# Altium footprint library Footprints_SOC.PcbLib: 182 footprints (part 11 of 12)
Each footprint in its own frame and in the unit in brackets; x right, y up, seen from the top. Pads: shape width x height; smd on the part's side, far side on the other; paste and mask are expansions set on the pad; w line width, h text height; cw(c..) or ccw(c..) is an arc to the next point about the centre after c.
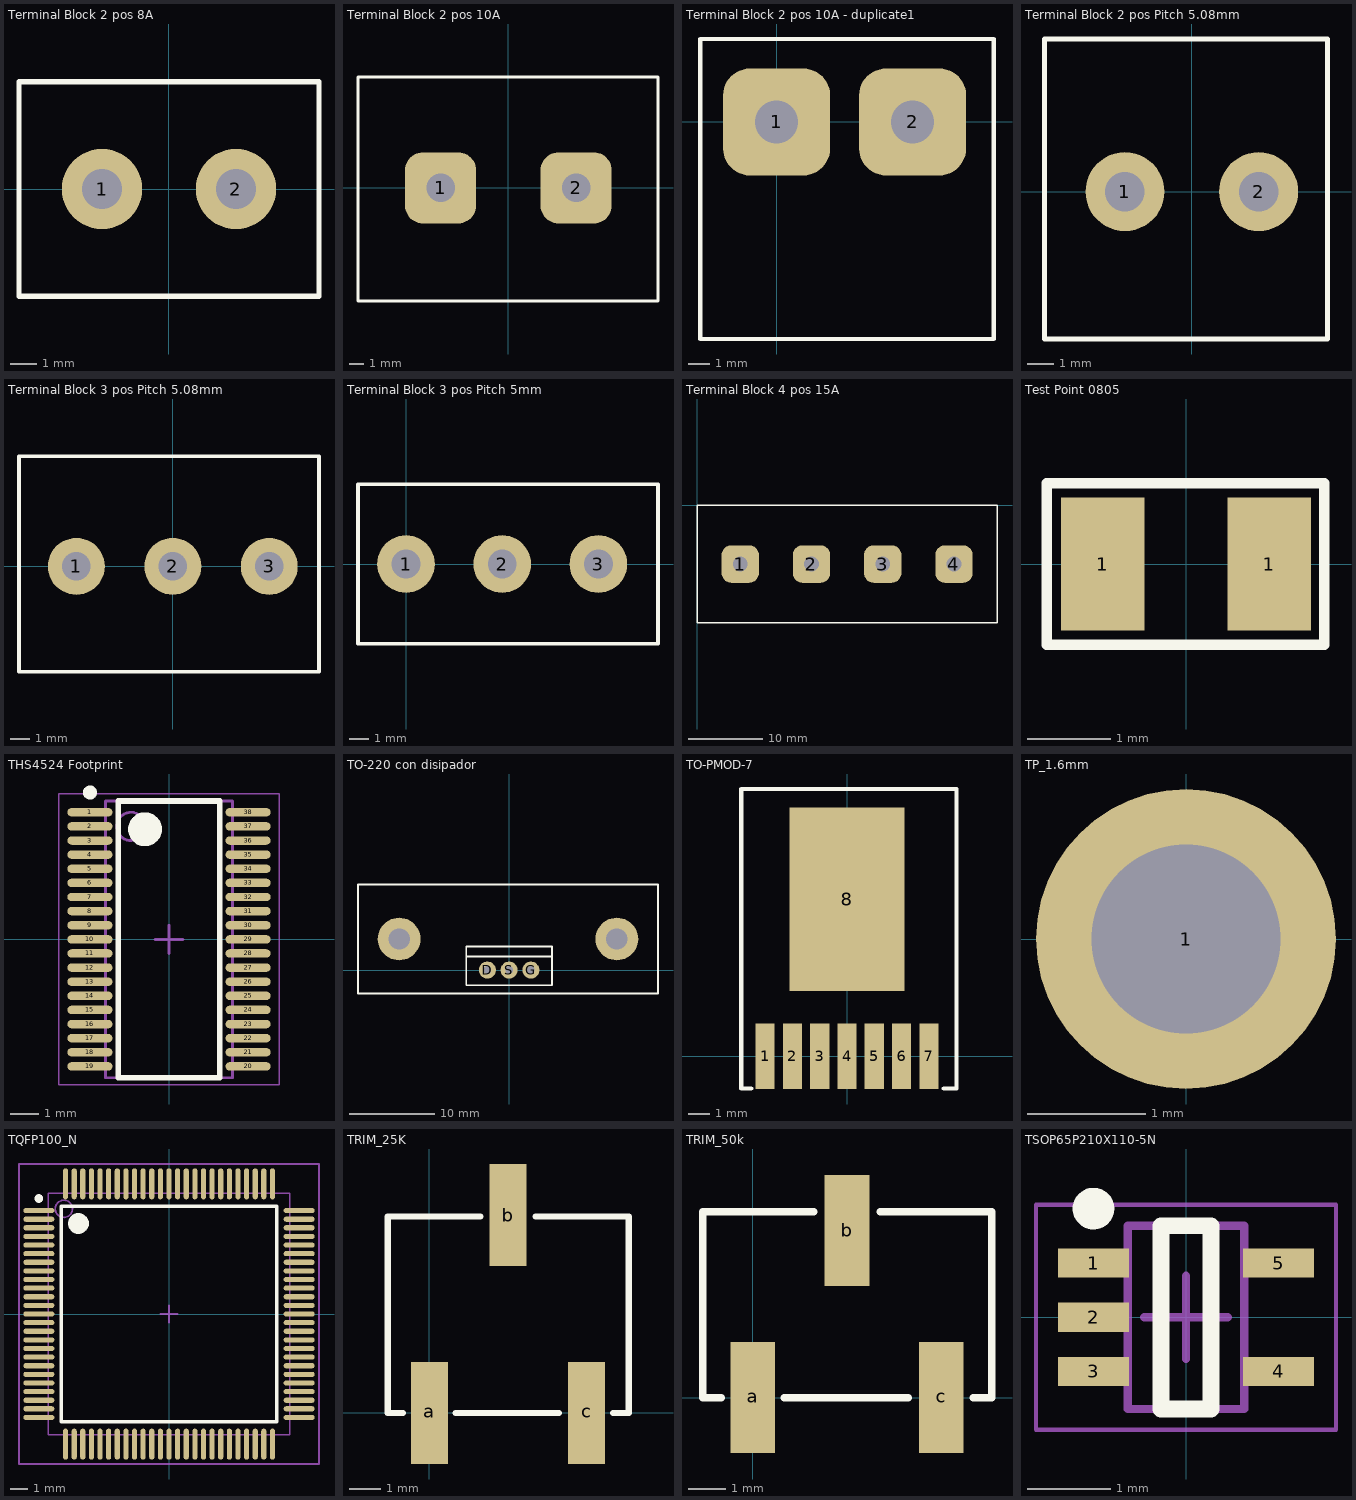
[diagram p10: the footprints below, top view; thin cyan lines are the x and y axes]

## Terminal Block 2 pos 8A [mm] "Wurth Electronics Inc. Pitch=5mm"
pads (2):
  round 3 hole 1.5: 1(-2.5,0) 2(2.5,0)
Top Overlay:
  lines w0.2: -5.6,-4 5.6,-4 5.6,4 -5.6,4 -5.6,-4
3D body "Terminal block pitch 5mm 2 pos (691111710002).stp": height 11.35, standoff -3.65, extent -5.6,-4 5.6,4

## Terminal Block 2 pos 10A [mm] "Molex (P/N: 0387206302) Pitch=9.53mm"
pads (2):
  rrect50% 5x5 hole 2: 1(-4.765,0) 2(4.765,0)
Top Overlay:
  lines w0.2: -10.566,-7.95 -10.566,7.798 10.516,7.798 10.516,-7.95 -10.566,-7.95
3D body "Terminal block 2 posiciones 10 A On Shore Technologies.stp": height 16.76, standoff -4.83, extent -10.566,-7.95 10.516,7.798

## Terminal Block 2 pos 10A - duplicate1 [mm] "On Shore Technology Inc. (P/N: OSTYK21102030) Pitch=6.35mm"
pads (2):
  rrect50% 5x5 hole 2: 1(0,0) 2(6.35,0)
Top Overlay:
  lines w0.2: -3.565,-10.13 -3.565,3.87 10.135,3.87 10.135,-10.13 -3.565,-10.13
3D body "OSTYK22102030.stp": height 12.7, standoff -4, extent -3.565,-10.13 10.135,3.87

## Terminal Block 2 pos Pitch 5.08mm [mm] "Wurth Electronics Inc. Pitch=5.08mm"
pads (2):
  round 3 hole 1.5: 1(-2.54,0) 2(2.54,0)
Top Overlay:
  lines w0.2: -5.6,-5.6 5.16,-5.6 5.16,5.8 -5.6,5.8 -5.6,-5.6
3D body "Terminal block 2 pos Pitch 5.08mm (691236510002).stp": height 18, standoff -4, extent -5.6,-5.575 5.16,5.775

## Terminal Block 3 pos Pitch 5.08mm [mm]
pads (3):
  round 3 hole 1.5: 1(-5.08,0) 2(0,0) 3(5.08,0)
Top Overlay:
  lines w0.2: -8.1,-5.55 7.7,-5.55 7.7,5.8 -8.1,5.8 -8.1,-5.55
3D body "Terminal Block 3 pos pitch 5.08mm 691236510003.stp": height 18, standoff -4, extent -8.14,-5.55 7.7,5.8

## Terminal Block 3 pos Pitch 5mm [mm]
pads (3):
  round 3 hole 1.5: 1(0,0) 2(5,0) 3(10,0)
Top Overlay:
  lines w0.2: -2.5,-4.15 -2.5,4.15 13.1,4.15 13.1,-4.15 -2.5,-4.15
3D body "Terminal block 3 posiciones pitch 5mm 691213710003.stp": height 11, standoff -2.8, extent -2.5,-4.15 13.1,4.15

## Terminal Block 4 pos 15A [mm] "Molex"
pads (4):
  rrect50% 5x5 hole 2: 1(5.786,-7.884) 2(15.316,-7.884) 3(24.846,-7.884) 4(34.376,-7.884)
Top Overlay:
  lines w0.2: 0,-15.748 0,0 40.132,0 40.132,-15.748 0,-15.748
3D body "regleta 15A molex 4 posiciones.stp": height 16.76, standoff -4.83, extent 0,-15.748 40.132,0

## Test Point 0805 [mm] "TE Connectivity AMP Connectors P/N: RCT-0C"
pads (2):
  rect 1x1.6 smd: 1(-1,0) 1(1,0)
Top Overlay:
  lines w0.127: -1.67,-0.97 1.66,-0.97 1.66,0.97 -1.67,0.97 -1.67,-0.97
3D body "test point 0805 (Part-Number RCT-0C).stp": height 1.43, standoff -0.02, extent -0.95,-0.635 1.05,0.64

## THS4524 Footprint [mm] "THS4524 4Ch Dif Amp, TSSOP"
height 1.2
pads (38):
  oval 1.6x0.3 smd mask+0.05: 1(-2.8,4.5) 2(-2.8,4) 3(-2.8,3.5) 4(-2.8,3) 5(-2.8,2.5) 6(-2.8,2) 7(-2.8,1.5) 8(-2.8,1) 9(-2.8,0.5) 10(-2.8,0) 11(-2.8,-0.5) 12(-2.8,-1) 13(-2.8,-1.5) 14(-2.8,-2) 15(-2.8,-2.5) 16(-2.8,-3) 17(-2.8,-3.5) 18(-2.8,-4) 19(-2.8,-4.5) 20(2.8,-4.5) 21(2.8,-4) 22(2.8,-3.5) 23(2.8,-3) 24(2.8,-2.5) 25(2.8,-2) 26(2.8,-1.5) 27(2.8,-1) 28(2.8,-0.5) 29(2.8,0) 30(2.8,0.5) 31(2.8,1) 32(2.8,1.5) 33(2.8,2) 34(2.8,2.5) 35(2.8,3) 36(2.8,3.5) 37(2.8,4) 38(2.8,4.5)
Top Overlay:
  circle w0.25: c-2.8,5.2 r0.125
  circle w0.6: c-0.85,3.9 r0.3
  lines w0.2: -1.803,-4.9 -1.803,4.9 1.803,4.9 1.803,-4.9 -1.803,-4.9
Mechanical 5:
  circle w0.1: c-1.35,4 r0.5
  lines w0.1: -2.25,-4.9 2.25,-4.9 2.25,4.9 -2.25,4.9 -2.25,-4.9
  text ".Designator" at 0,0 h1.02
Mechanical 15:
  lines w0.05: -3.9,-5.15 -3.9,5.15 3.9,5.15 3.9,-5.15 -3.9,-5.15
  lines w0.1: -0.5,0 0.5,0 ; 0,-0.5 0,0.5
3D body: height 1.2, standoff 0.05, extent -2.25,-4.9 2.25,4.9

## TO-220 con disipador [mm]
pads (5):
  round 2 hole 0.9: D(-2.54,0) G(2.54,0) S(0,0)
  round 5 hole 2.5: ""(-12.829,3.625) ""(12.571,3.625)
Top Overlay:
  lines w0.2: -17.629,9.964 -17.629,-2.725 17.369,-2.725 17.369,9.974 -17.629,9.974 ; -4.999,1.575 5.001,1.575 ; -5,-1.76 5,-1.76 5,2.758 -5,2.758 -5,-1.76
3D body "Disipador TO-220 (CUI_HSE-B20254-035H-02).step": height 25.4, standoff -3.5, extent -17.629,-2.725 17.369,9.974
3D body "TO-220 Vertical.step": height 21.04, standoff 0.31, extent -5,-1.76 5,2.758

## TO-PMOD-7 [mm]
pads (8):
  rect 0.89x3.06 smd: 1(-3.81,0) 2(-2.54,0) 3(-1.27,0) 4(0,0) 5(1.27,0) 6(2.54,0) 7(3.81,0)
  rect 5.35x8.54 smd: 8(0,7.305)
Top Overlay:
  lines w0.2: -4.46,-1.51 -4.92,-1.51 -4.92,12.44 5.1,12.44 5.1,-1.51 4.5,-1.51
3D body "TO-PMOD-7.step": height 4.57, standoff 0, extent -5.06,-1.388 5.1,12.388

## TP_1.6mm [mm]
pads (1):
  round 2.54 hole 1.6: 1(0,0)
Top Overlay:
  text ".Comment" at 1.778,-0.485 h2.54
3D body "User Library-testpoint.STEP": height 5.74, standoff -3.13, extent -1.587,-1.662 1.587,1.513

## TQFP100_N [mm] "Thin QFP, 100-Leads, Body 14x14mm, Pitch 0.5mm, IPC Medium Density"
height 1.2
pads (100):
  oval 1.8x0.3 smd: 1(-7.55,6) 2(-7.55,5.5) 3(-7.55,5) 4(-7.55,4.5) 5(-7.55,4) 6(-7.55,3.5) 7(-7.55,3) 8(-7.55,2.5) 9(-7.55,2) 10(-7.55,1.5) 11(-7.55,1) 12(-7.55,0.5) 13(-7.55,0) 14(-7.55,-0.5) 15(-7.55,-1) 16(-7.55,-1.5) 17(-7.55,-2) 18(-7.55,-2.5) 19(-7.55,-3) 20(-7.55,-3.5) 21(-7.55,-4) 22(-7.55,-4.5) 23(-7.55,-5) 24(-7.55,-5.5) 25(-7.55,-6) 51(7.55,-6) 52(7.55,-5.5) 53(7.55,-5) 54(7.55,-4.5) 55(7.55,-4) 56(7.55,-3.5) 57(7.55,-3) 58(7.55,-2.5) 59(7.55,-2) 60(7.55,-1.5) 61(7.55,-1) 62(7.55,-0.5) 63(7.55,0) 64(7.55,0.5) 65(7.55,1) 66(7.55,1.5) 67(7.55,2) 68(7.55,2.5) 69(7.55,3) 70(7.55,3.5) 71(7.55,4) 72(7.55,4.5) 73(7.55,5) 74(7.55,5.5) 75(7.55,6)
  oval 0.3x1.8 smd: 26(-6,-7.55) 27(-5.5,-7.55) 28(-5,-7.55) 29(-4.5,-7.55) 30(-4,-7.55) 31(-3.5,-7.55) 32(-3,-7.55) 33(-2.5,-7.55) 34(-2,-7.55) 35(-1.5,-7.55) 36(-1,-7.55) 37(-0.5,-7.55) 38(0,-7.55) 39(0.5,-7.55) 40(1,-7.55) 41(1.5,-7.55) 42(2,-7.55) 43(2.5,-7.55) 44(3,-7.55) 45(3.5,-7.55) 46(4,-7.55) 47(4.5,-7.55) 48(5,-7.55) 49(5.5,-7.55) 50(6,-7.55) 76(6,7.55) 77(5.5,7.55) 78(5,7.55) 79(4.5,7.55) 80(4,7.55) 81(3.5,7.55) 82(3,7.55) 83(2.5,7.55) 84(2,7.55) 85(1.5,7.55) 86(1,7.55) 87(0.5,7.55) 88(0,7.55) 89(-0.5,7.55) 90(-1,7.55) 91(-1.5,7.55) 92(-2,7.55) 93(-2.5,7.55) 94(-3,7.55) 95(-3.5,7.55) 96(-4,7.55) 97(-4.5,7.55) 98(-5,7.55) 99(-5.5,7.55) 100(-6,7.55)
Top Overlay:
  circle w0.6: c-5.25,5.25 r0.3
  circle w0.25: c-7.55,6.7 r0.125
  lines w0.2: -6.25,-6.25 6.25,-6.25 6.25,6.25 -6.25,6.25 -6.25,-6.25
Mechanical 13:
  circle w0.1: c-6.1,6.1 r0.5
  lines w0.1: -7,-7 7,-7 7,7 -7,7 -7,-7
Mechanical 15:
  lines w0.1: -0.5,0 0.5,0 ; 0,-0.5 0,0.5 ; -8.7,-8.7 8.7,-8.7 8.7,8.7 -8.7,8.7 -8.7,-8.7
3D body "TQFP 100.stp": height 1.1, standoff 0, extent -8.011,-8.011 8.011,8.011

## TRIM_25K [mm] "3361P-1-253GLFCT-ND"
pads (3):
  rect 1.2x3.3 smd: a(0,0) b(2.54,6.4) c(5.08,0)
Top Overlay:
  lines w0.2: -0.85,0 -1.35,0 -1.35,6.35 1.651,6.35 ; 0.85,0 4.191,0 ; 3.429,6.35 6.444,6.35 6.444,0 5.944,0
3D body: height 2.7, standoff 0, extent -1.397,0 6.35,6.35

## TRIM_50k [mm] "Vishay Series TS63"
pads (3):
  rect 1.2x3 smd: a(0,0) b(2.54,4.5) c(5.08,0)
Top Overlay:
  lines w0.2: -0.85,0 -1.35,0 -1.35,5 1.651,5 ; 0.85,0 4.191,0 ; 3.429,5 6.444,5 6.444,0 5.944,0

## TSOP65P210X110-5N [mm] "TSOP, 5-Leads, Body 2,00x1,25mm, Pitch 0,65mm, IPC Medium Density"
height 1.1
pads (5):
  rect 0.85x0.35 smd: 1(-1.11,0.65) 2(-1.11,0) 3(-1.11,-0.65) 4(1.11,-0.65) 5(1.11,0.65)
Top Overlay:
  circle w0.25: c-1.11,1.304 r0.125
  lines w0.2: -0.3,-1.1 -0.3,1.1 0.3,1.1 0.3,-1.1 -0.3,-1.1
Mechanical 13:
  lines w0.1: -0.7,-1.1 -0.7,1.1 0.7,1.1 0.7,-1.1 -0.7,-1.1
Mechanical 15:
  lines w0.05: -1.8,-1.35 -1.8,1.35 1.8,1.35 1.8,-1.35 -1.8,-1.35
  lines w0.1: -0.5,0 0.5,0 ; 0,-0.5 0,0.5
3D body: height 1.1, standoff 0.1, extent -0.7,-1.1 0.7,1.1